# Altium footprint library AD常用3D封装.PCBLIB: 342 footprints (part 20 of 22)
Each footprint in its own frame and in the unit in brackets; x right, y up, seen from the top. Pads: shape width x height; smd on the part's side, far side on the other; paste and mask are expansions set on the pad; w line width, h text height; cw(c..) or ccw(c..) is an arc to the next point about the centre after c.
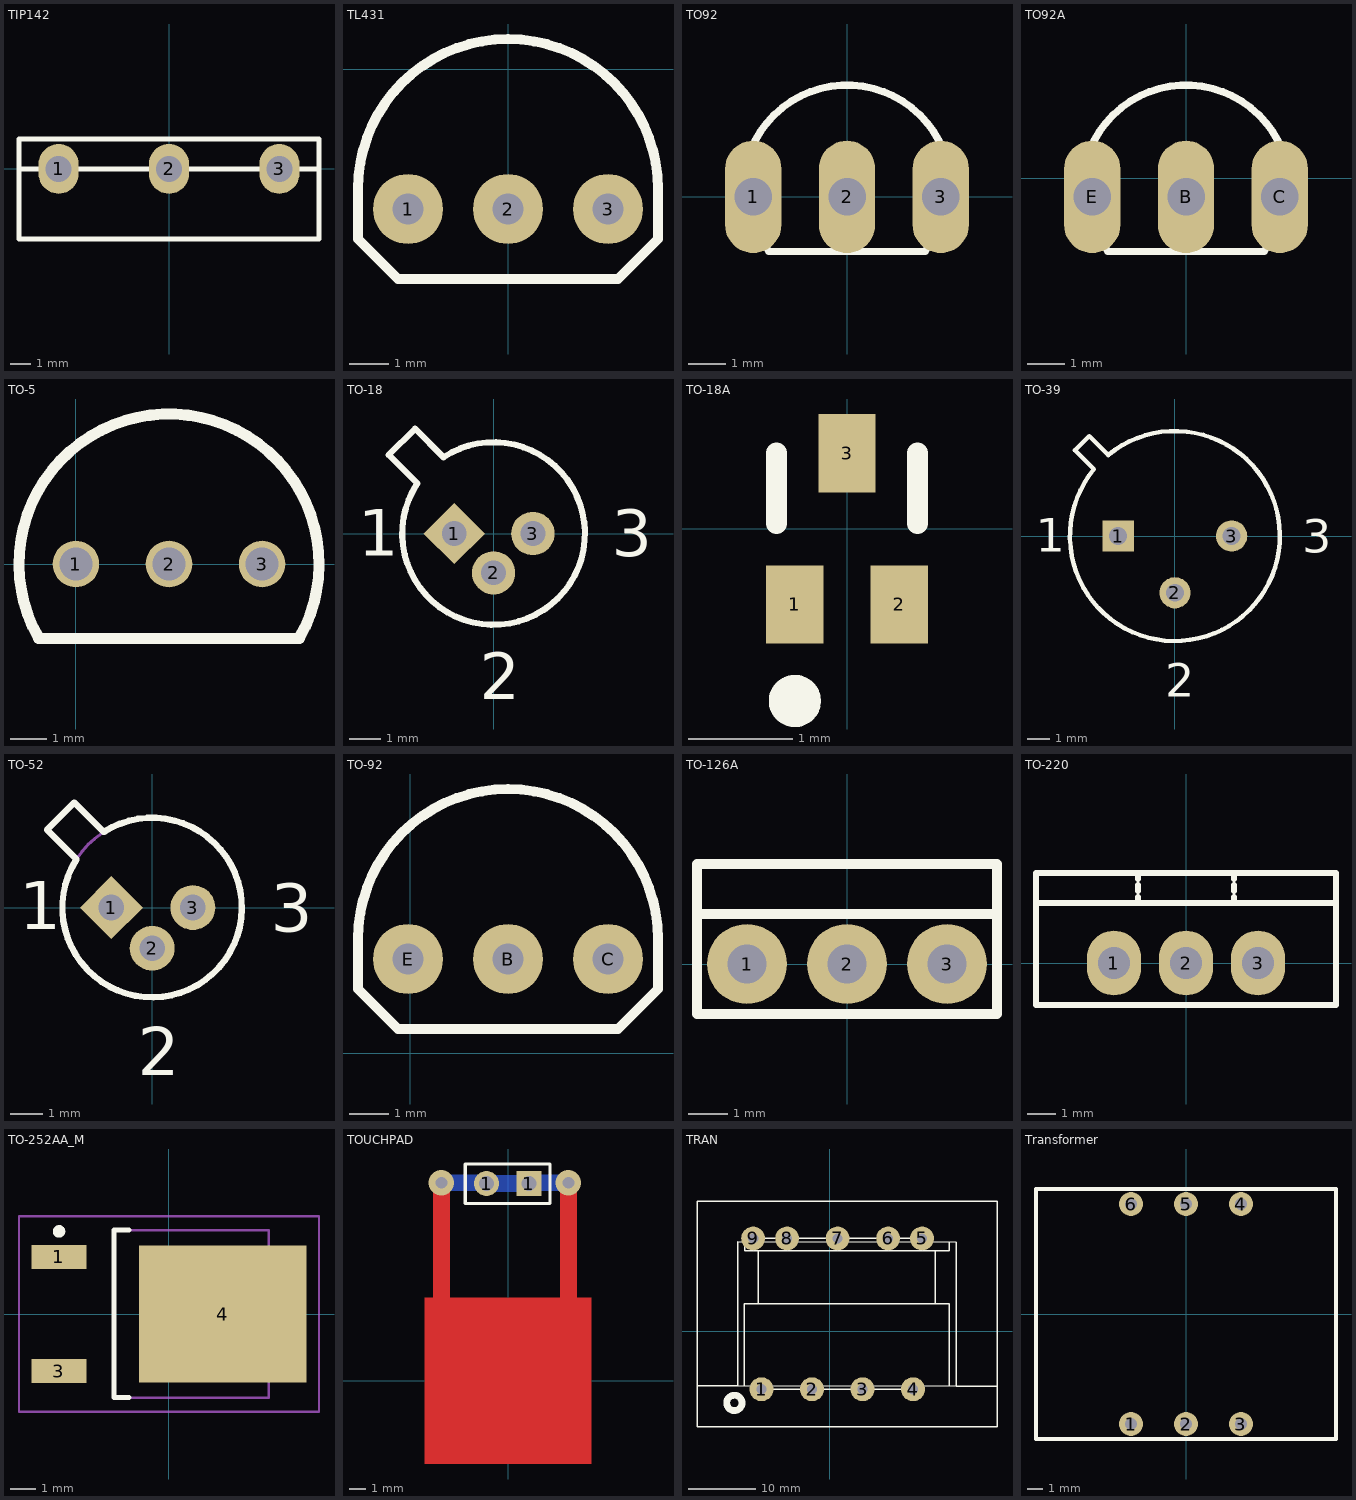
[diagram p19: the footprints below, top view; thin cyan lines are the x and y axes]

## TIP142 [mil]
pads (3):
  oval 79x98 hole 51: 1(-217,0) 2(0,0) 3(217,0)
TopOverlay:
  lines w10: -295,0 295,0 ; -295,-138 295,-138 295,59 -295,59 -295,-138

## TL431 [mil]
pads (3):
  round 70 hole 31.5: 1(-100,-140) 2(0,-140) 3(100,-140)
TopOverlay:
  lines w10: -150,-170 -110,-210 110,-210 150,-170 150,-120 ccw(c0,-120) -150,-120 -150,-170

## TO92 [mil]
pads (3):
  oval 60x120 hole 40: 1(-100,0) 2(0,0) 3(100,0)
TopOverlay:
  lines w7.87: -102.76,49.85 cw(c0,8.33) 102.76,49.85 ; -89.08,-49.71 -83.33,-58.33 83.33,-58.33 89.08,-49.71
3D body: height 251.97, standoff -192.86, extent -107.87,-61.56 109.87,99

## TO92A [mil]
pads (3):
  oval 60x120 hole 40: B(0,-20) C(100,-20) E(-100,-20)
TopOverlay:
  lines w7.87: -102.76,29.85 cw(c0,-11.67) 102.76,29.85 ; -89.08,-69.71 -83.33,-78.33 83.33,-78.33 89.08,-69.71

## TO-5 [mm]
pads (3):
  round 1.27 hole 0.9: 1(0,0) 2(2.54,0) 3(5.08,0)
TopOverlay:
  lines w0.305: -1.016,-2.032 cw(c2.54,0) 6.096,-2.032 -1.016,-2.032

## TO-18 [mm] "Can; 3 Leads; Pin Circle Dia. 2.54 mm; Lead Dia. 0.48 mm (max)"
height 5.33
pads (3):
  rect 1.4x1.4 hole 0.8 rot 45: 1(-1.27,0)
  round 1.4 hole 0.8: 2(0,-1.27) 3(1.27,0)
TopOverlay:
  lines w0.2: -3.386,2.537 -2.537,3.386 -1.618,2.467 cw(c0,0) -2.467,1.618 -3.386,2.537
  text "1" at -4.38,-0.719 h1.5
  text "2" at -0.443,-5.355 h1.5
  text "3" at 3.812,-0.742 h1.5
3D body: height 4.9, standoff -5, extent -4.428,-3.729 3.755,4.454

## TO-18A [mm] "SC-89; 3 Flat Leads; Body 1.6 x 1.6 x 0.7 mm, inc leads (LxWxH typ)"
height 0.8
pads (3):
  rect 0.55x0.75 smd: 1(-0.5,-0.725) 2(0.5,-0.725) 3(0,0.725)
TopOverlay:
  circle w0.25: c-0.5,-1.65 r0.125
  lines w0.2: -0.676,0.05 -0.676,0.725 ; 0.675,0.05 0.675,0.725

## TO-39 [mm] "Can; 3 Leads; Pin Circle Dia. 5.08 mm; Lead Dia. 0.48 mm (max)"
height 4.55
pads (3):
  rect 1.4x1.4 hole 0.8: 1(-2.54,0)
  round 1.4 hole 0.8: 2(0,-2.54) 3(2.54,0)
TopOverlay:
  lines w0.2: -4.475,3.838 -3.838,4.475 -2.99,3.626 cw(c0,0) -3.626,2.99 -4.475,3.838
  text "3" at 5.712,-0.751 h1.5
  text "2" at -0.433,-7.203 h1.5
  text "1" at -6.219,-0.697 h1.5
3D body: height 6.6, standoff -11.82, extent -4.712,-4.751 4.675,4.649

## TO-52 [mm] "Can; 3 Leads; Pin Circle Dia. 2.54 mm"
height 2.67
pads (3):
  rect 1.4x1.4 hole 0.8 rot 45: 1(-1.27,0)
  round 1.4 hole 0.8: 2(0,-1.27) 3(1.27,0)
TopOverlay:
  lines w0.2: -3.277,2.429 -2.429,3.277 -1.51,2.358 cw(c0,0) -2.358,1.51 -3.277,2.429
  text "1" at -4.153,-0.68 h1.5
  text "2" at -0.442,-5.239 h1.5
  text "3" at 3.706,-0.751 h1.5
Mechanical1:
  circle w0.1: c0,0 r2.8
3D body: height 4.08, standoff -12.7, extent -4.88,-4.051 4.051,4.88

## TO-92 [mil]
pads (3):
  round 70 hole 31.5: B(98,94) C(198,94) E(-2,94)
TopOverlay:
  lines w10: -52,64 -12,24 208,24 248,64 248,114 ccw(c98,114) -52,114 -52,64

## TO-126A [mil]
pads (3):
  round 80 hole 39: 1(-100,0) 2(0,0) 3(100,0)
TopOverlay:
  lines w10: 150,40 150,100 -150,100 -150,50 ; -150,50 150,50 150,-50 -150,-50 -150,50
3D body: height 535.43, standoff -171.07, extent -153.54,-71 153.55,35.31

## TO-220 [mil]
pads (3):
  oval 75x90 hole 45: 1(-100,0) 2(0,0) 3(100,0)
TopOverlay:
  lines w7.87: -66.67,83.33 -66.67,91.67 ; -66.67,100 -66.67,108.33 ; -66.67,116.67 -66.67,125 ; 66.67,83.33 66.67,91.67 ; 66.67,100 66.67,108.33 ; 66.67,116.67 66.67,125 ; -208.33,83.33 208.33,83.33 ; -208.33,83.33 -208.33,-58.33 208.33,-58.33 208.33,83.33 ; -208.33,83.33 -208.33,125 208.33,125 208.33,83.33
3D body: height 728.35, standoff -401.57, extent -205,-55 205.24,120.59

## TO-252AA_M [mm] "D-PAK, 4-Leads, Body 6.1x6.5mm, Pitch 2.28mm, Lead Span 9.8mm, IPC Low Density"
height 2.38
pads (3):
  rect 2.2x0.95 smd: 1(-4.4,2.28) 3(-4.4,-2.28)
  rect 6.7x5.5 smd: 4(2.15,0)
TopOverlay:
  circle w0.25: c-4.4,3.305 r0.125
  lines w0.2: -1.6,-3.35 -2.2,-3.35 -2.2,3.35 -1.6,3.35
Mechanical13:
  lines w0.1: -2.2,-3.35 -2.2,3.35 4,3.35 4,-3.35 -2.2,-3.35
Mechanical15:
  lines w0.1: -0.5,0 0.5,0 ; 0,-0.5 0,0.5 ; -6,-3.9 -6,3.9 6,3.9 6,-3.9 -6,-3.9
3D body: height 2.39, standoff -0.02, extent -4.9,-3.27 5.038,3.27

## TOUCHPAD [mm]
pads (2):
  round 1.5 hole 0.9: 1(-1.29,11.83)
  rect 1.5x1.5 hole 0.9: 1(1.25,11.83)
via -4,11.875 diameter 1.524 hole 0.711
via 3.625,11.875 diameter 1.524 hole 0.711
TopLayer:
  rectangle: -5,-5 5,5
  lines w1.016: -4,3.875 -4,11.875 ; 3.625,2.375 3.625,11.875
BottomLayer:
  rectangle: 4.246,-4.767 4.745,-4.267
  rectangle: 3.246,-4.767 3.745,-4.267
  rectangle: 2.246,-4.767 2.746,-4.267
  rectangle: 1.246,-4.767 1.746,-4.267
  rectangle: 0.246,-4.767 0.746,-4.267
  rectangle: -0.754,-4.767 -0.255,-4.267
  rectangle: -1.754,-4.767 -1.255,-4.267
  rectangle: -2.754,-4.767 -2.254,-4.267
  rectangle: -3.754,-4.767 -3.254,-4.267
  rectangle: -4.754,-4.767 -4.255,-4.267
  rectangle: 4.246,-3.767 4.745,-3.267
  rectangle: 3.246,-3.767 3.745,-3.267
  rectangle: 2.246,-3.767 2.746,-3.267
  rectangle: 1.246,-3.767 1.746,-3.267
  rectangle: 0.246,-3.767 0.746,-3.267
  rectangle: -0.754,-3.767 -0.255,-3.267
  rectangle: -1.754,-3.767 -1.255,-3.267
  rectangle: -2.754,-3.767 -2.254,-3.267
  rectangle: -3.754,-3.767 -3.254,-3.267
  rectangle: -4.754,-3.767 -4.255,-3.267
  rectangle: 4.246,-2.767 4.745,-2.267
  rectangle: 3.246,-2.767 3.745,-2.267
  rectangle: 2.246,-2.767 2.746,-2.267
  rectangle: 1.246,-2.767 1.746,-2.267
  rectangle: 0.246,-2.767 0.746,-2.267
  rectangle: -0.754,-2.767 -0.255,-2.267
  rectangle: -1.754,-2.767 -1.255,-2.267
  rectangle: -2.754,-2.767 -2.254,-2.267
  rectangle: -3.754,-2.767 -3.254,-2.267
  rectangle: -4.754,-2.767 -4.255,-2.267
  rectangle: 4.246,-1.767 4.745,-1.267
  rectangle: 3.246,-1.767 3.745,-1.267
  rectangle: 2.246,-1.767 2.746,-1.267
  rectangle: 1.246,-1.767 1.746,-1.267
  rectangle: 0.246,-1.767 0.746,-1.267
  rectangle: -0.754,-1.767 -0.255,-1.267
  rectangle: -1.754,-1.767 -1.255,-1.267
  rectangle: -2.754,-1.767 -2.254,-1.267
  rectangle: -3.754,-1.767 -3.254,-1.267
  rectangle: -4.754,-1.767 -4.255,-1.267
  rectangle: 4.246,-0.767 4.745,-0.267
  rectangle: 3.246,-0.767 3.745,-0.267
  rectangle: 2.246,-0.767 2.746,-0.267
  rectangle: 1.246,-0.767 1.746,-0.267
  rectangle: 0.246,-0.767 0.746,-0.267
  rectangle: -0.754,-0.767 -0.255,-0.267
  rectangle: -1.754,-0.767 -1.255,-0.267
  rectangle: -2.754,-0.767 -2.254,-0.267
  rectangle: -3.754,-0.767 -3.254,-0.267
  rectangle: -4.754,-0.767 -4.255,-0.267
  rectangle: 4.246,0.233 4.745,0.733
  rectangle: 3.246,0.233 3.745,0.733
  rectangle: 2.246,0.233 2.746,0.733
  rectangle: 1.246,0.233 1.746,0.733
  rectangle: 0.246,0.233 0.746,0.733
  rectangle: -0.754,0.233 -0.255,0.733
  rectangle: -1.754,0.233 -1.255,0.733
  rectangle: -2.754,0.233 -2.254,0.733
  rectangle: -3.754,0.233 -3.254,0.733
  rectangle: -4.754,0.233 -4.255,0.733
  rectangle: 4.246,1.233 4.745,1.733
  rectangle: 3.246,1.233 3.745,1.733
  rectangle: 2.246,1.233 2.746,1.733
  rectangle: 1.246,1.233 1.746,1.733
  rectangle: 0.246,1.233 0.746,1.733
  rectangle: -0.754,1.233 -0.255,1.733
  rectangle: -1.754,1.233 -1.255,1.733
  rectangle: -2.754,1.233 -2.254,1.733
  rectangle: -3.754,1.233 -3.254,1.733
  rectangle: -4.754,1.233 -4.255,1.733
  rectangle: 4.246,2.233 4.745,2.733
  rectangle: 3.246,2.233 3.745,2.733
  rectangle: 2.246,2.233 2.746,2.733
  rectangle: 1.246,2.233 1.746,2.733
  rectangle: 0.246,2.233 0.746,2.733
  rectangle: -0.754,2.233 -0.255,2.733
  rectangle: -1.754,2.233 -1.255,2.733
  rectangle: -2.754,2.233 -2.254,2.733
  rectangle: -3.754,2.233 -3.254,2.733
  rectangle: -4.754,2.233 -4.255,2.733
  rectangle: 4.246,3.233 4.745,3.733
  rectangle: 3.246,3.233 3.745,3.733
  rectangle: 2.246,3.233 2.746,3.733
  rectangle: 1.246,3.233 1.746,3.733
  rectangle: 0.246,3.233 0.746,3.733
  rectangle: -0.754,3.233 -0.255,3.733
  rectangle: -1.754,3.233 -1.255,3.733
  rectangle: -2.754,3.233 -2.254,3.733
  rectangle: -3.754,3.233 -3.254,3.733
  rectangle: -4.754,3.233 -4.255,3.733
  rectangle: 4.246,4.233 4.745,4.733
  rectangle: 3.246,4.233 3.745,4.733
  rectangle: 2.246,4.233 2.746,4.733
  rectangle: 1.246,4.233 1.746,4.733
  rectangle: 0.246,4.233 0.746,4.733
  rectangle: -0.754,4.233 -0.255,4.733
  rectangle: -1.754,4.233 -1.255,4.733
  rectangle: -2.754,4.233 -2.254,4.733
  rectangle: -3.754,4.233 -3.254,4.733
  rectangle: -4.754,4.233 -4.255,4.733
  lines w1.016: -4,11.875 -1.335,11.875 ; -1.29,11.83 1.25,11.83 ; 1.295,11.875 3.625,11.875
TopOverlay:
  lines w0.2: -2.56,10.625 -2.56,13 2.52,13 2.52,10.625 -2.56,10.625

## TRAN [mil]
pads (9):
  round 140 hole 60: 1(-400,-340) 2(-104,-340) 3(192,-340) 4(488,-340) 5(541,544) 6(342,544) 7(46,544) 8(-250,544) 9(-449,544)
TopOverlay:
  circle w40: c-559.1,-420 r45.1
  lines w8: -778,-319 -540,-319 ; -500,-318 -500,160 -460,160 660,160 699,160 699,-321 ; -498,523 -498,471 698,471 699,472 699,521 ; -450,544 541,544 ; -420,160 -420,469 ; -402,-340 488,-340 ; 617,160 617,470 ; 980,-321 742,-321 ; -540,-319 -540,523 742,521 742,-321 ; -540,-319 742,-321 ; -778,-561 980,-561 980,763 -778,763 -778,-561

## Transformer [mil]
pads (6):
  round 60 hole 30: 1(-137.5,-275) 2(0,-275) 3(137.5,-275) 4(137.5,275) 5(0,275) 6(-137.5,275)
TopOverlay:
  lines w10: -375,-312.5 -375,312.5 375,312.5 375,-312.5 -375,-312.5
3D body: height 590.55, standoff -39.37, extent -372.01,-314.95 376.02,314.97